# Altium integrated library CbyP.IntLib: 1144 symbols (part 2 of 6) (continued)
## FRC0603F2203TS (continued)
RES 220kΩ ±1% 100mW 0603; Manufacturer: FOJAN; Mfr.Part #: FRC0603F2203TS; Package: 0402; LCSC Part #: C2907013
footprint RES-0402
pins: 1, 2

## FRC0603F3602TS
designator R?, comment 36K
RES 36kΩ ±1% 100mW 0603; Manufacturer: FOJAN; Mfr.Part #: FRC0603F3602TS; Package: 0603; LCSC Part #: C2930097
footprint RES-0603
pins: 1, 2

## FRC0603F3901TS
designator R?, comment 3.9K
3.9kΩ ±1% 100mW 0603 Thick Film Resistor; Manufacturer: FOJAN; Mfr.Part #: FRC0603F3901TS; Package: 0603; LCSC Part #: C2907024; DigiKey Part Number: NO; ComponentLink1Description: Link; ComponentLink1URL: https://www.lcsc.com/product-detail/C2907024.html?s_z=n_3.9K; ComponentLink2Description: Link 1
footprint RES-0603
pins: 1, 2

## FRC0603F4992TS
designator R?, comment 49.9K
49.9kΩ ±1% 100mW 0603 Thick Film Resistor; Manufacturer: FOJAN; Mfr.Part #: FRC0603F4992TS; Package: 0603; LCSC Part #: C2930109; DigiKey Part Number: NO; ComponentLink1Description: Link; ComponentLink1URL: https://www.lcsc.com/product-detail/C2930109.html?s_z=n_49.9K; ComponentLink2Description: Link 1
footprint RES-0603
pins: 1, 2

## FRC0603F5231TS
designator R?, comment 5.23K
RES 5.23kΩ ±1% 100mW 0603; Manufacturer: FOJAN; Mfr.Part #: FRC0603F5231TS; Package: 0603; LCSC Part #: C2930111
footprint RES-0603
pins: 1, 2

## FRC0603F5600TS
designator R?, comment 560R
560Ω ±1% 100mW 0603 Thick Film Resistor; Manufacturer: FOJAN; Mfr.Part #: FRC0603F6492TS; Package: 0603; LCSC Part #: C2907052; DigiKey Part Number: NO; ComponentLink1Description: Link; ComponentLink1URL: https://www.lcsc.com/product-detail/C2907052.html?s_z=n_560r; ComponentLink2Description: Link 1
footprint RES-0603
footprint RES-0603-2
pins: 1, 2

## FRC0603F6201TS
designator R?, comment 6.2K
6.2kΩ ±1% 100mW 0603 Thick Film Resistor; Manufacturer: FOJAN; Mfr.Part #: FRC0603F6201TS; Package: 0603; LCSC Part #: C2907054; DigiKey Part Number: NO; ComponentLink1Description: Link; ComponentLink1URL: https://www.lcsc.com/product-detail/C2907054.html?s_z=n_6.2K; ComponentLink2Description: Link 1
footprint RES-0603
pins: 1, 2

## FRC0603F6492TS
designator R?, comment 64.9K
64.9kΩ ±1% 100mW 0603 Thick Film Resistor; Manufacturer: FOJAN; Mfr.Part #: FRC0603F6492TS; Package: 0603; LCSC Part #: C2960807; DigiKey Part Number: NO; ComponentLink1Description: Link; ComponentLink1URL: https://www.lcsc.com/product-detail/C2960807.html; ComponentLink2Description: Link 1
footprint RES-0603
pins: 1, 2

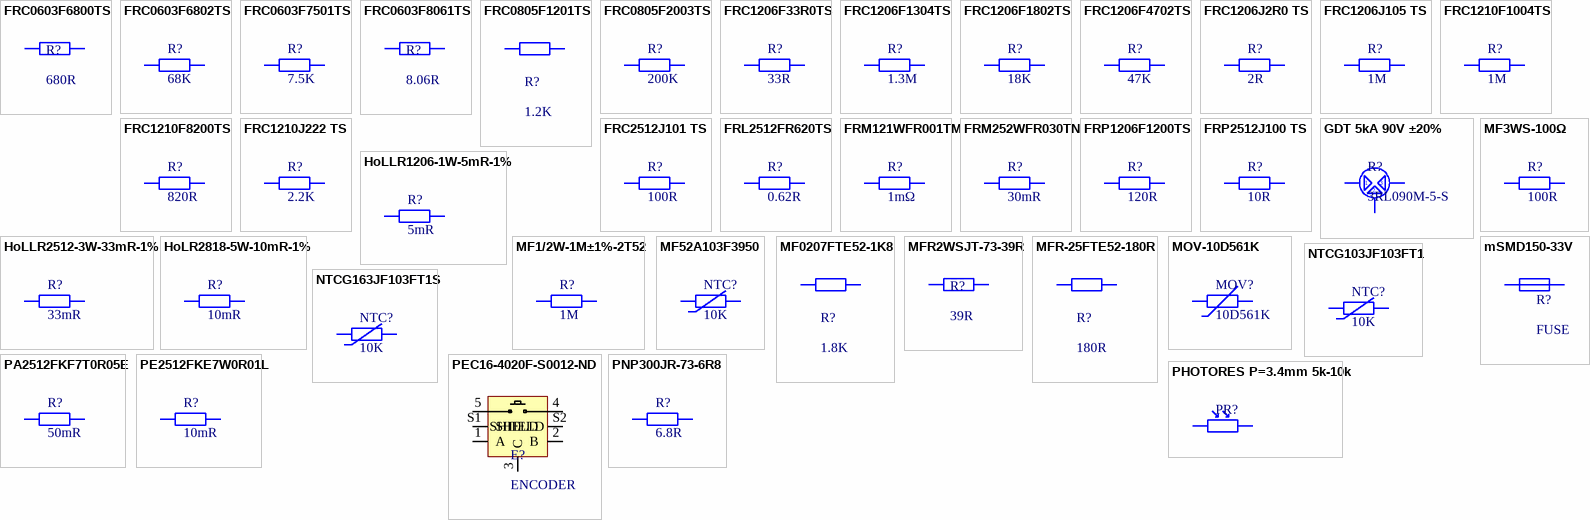
[diagram p9: symbols FRC0603F6800TS to PNP300JR-73-6R8]

## FRC0603F6800TS
designator R?, comment 680R
680Ω ±1% 100mW 0603 Thick Film Resistor; Manufacturer: FOJAN; Mfr.Part #: FRC0603F6800TS; Package: 0603; LCSC Part #: C2907062; DigiKey Part Number: NO; ComponentLink1Description: Link; ComponentLink1URL: https://www.lcsc.com/product-detail/C2907062.html?s_z=n_680r; ComponentLink2Description: Link 1
footprint RES-0603
pins: 1, 2

## FRC0603F6802TS
designator R?, comment 68K
68kΩ ±1% 100mW 0603 Thick Film Resistor; Manufacturer: FOJAN; Mfr.Part #: FRC0603F6802TS; Package: 0603; LCSC Part #: C2907063; DigiKey Part Number: NO; ComponentLink1Description: Link; ComponentLink1URL: https://www.lcsc.com/product-detail/C2907063.html?s_z=n_68K; ComponentLink2Description: Link 1
footprint RES-0603
pins: 1, 2

## FRC0603F7501TS
designator R?, comment 7.5K
7.5kΩ ±1% 100mW 0603 Thick Film Resistor; Manufacturer: FOJAN; Mfr.Part #: FOJAN; Package: 0603; LCSC Part #: C2930127; DigiKey Part Number: NO; ComponentLink1Description: Link; ComponentLink1URL: https://www.lcsc.com/product-detail/C2930127.html?s_z=n_7.5K&spm=wm.ssy.bg.0.xh&lcsc_vid=QVhYA1deElkMBVEAQVVWVAECEVVXUAcCTgNYUQVSEVAxVlNRQ1JdUlBST1daVzsOAxUeFF5JWBYZEEoKFBINSQcJGk4eFQsCAgIaSgADAwAHC0slRVVbVV1fT08GEwkK; ComponentLink2Description: Link 1
footprint RES-0603
pins: 1, 2

## FRC0603F8061TS
designator R?, comment 8.06R
8.06kΩ ±1% 100mW 0603 Thick Film Resistor; Manufacturer: FOJAN; Mfr.Part #: FRC0603F8061TS; Package: 0603; LCSC Part #: C2960681; DigiKey Part Number: NO; ComponentLink1Description: Link; ComponentLink1URL: https://www.lcsc.com/product-detail/C2960681.html?s_z=n_8.06; ComponentLink2Description: Link 1
footprint RES-0603
pins: 1, 2

## FRC0805F1201TS
designator R?, comment 1.2K
1.2kΩ ±1% 125mW 0805 Thick Film Resistor; Manufacturer: FOJAN; Mfr.Part #: FRC0805F1201TS; Package: 0805; LCSC Part #: C2933293; DigiKey Part Number: NO; ComponentLink1Description: Link; ComponentLink1URL: https://www.lcsc.com/product-detail/C2933293.html?s_z=n_1.2K; ComponentLink2Description: Link 1
footprint RES-0805-1
footprint RES-0805
pins: 1, 2

## FRC0805F2003TS
designator R?, comment 200K
RES 200kΩ ±1% 125mW 0805; Manufacturer: FOJAN; Mfr.Part #: FRC0805F2003TS; Package: 0805; LCSC Part #: C2907238; ComponentLink2Description: Link 1
footprint RES-0805-1
pins: 1, 2

## FRC1206F33R0TS
designator R?, comment 33R
RES 33Ω ±1% 250mW 1206; Manufacturer: FOJAN; Mfr.Part #: FRC1206F33R0TS; Package: 1206; LCSC Part #: C2907384
footprint RES-1206
pins: 1, 2

## FRC1206F1304TS
designator R?, comment 1.3M
RES 1.3MΩ ±1% 250mW 1206; Manufacturer: FOJAN; Mfr.Part #: FRC1206F1304TS; LCSC Part #: C2933594; Package: 1206
footprint RES-1206
pins: 1, 2

## FRC1206F1802TS
designator R?, comment 18K
RES 18kΩ ±1% 250mW 1206; Manufacturer: FOJAN; Mfr.Part #: FRC1206F1802TS; LCSC Part #: C2933614; Package: 1206
footprint RES-1206
pins: 1, 2

## FRC1206F4702TS
designator R?, comment 47K
RES 47kΩ ±1% 250mW 1206; Manufacturer: FOJAN; Mfr.Part #: FRC1206F4702TS; Package: 1206; LCSC Part #: C2933708
footprint RES-1206
pins: 1, 2

## FRC1206J2R0 TS
designator R?, comment 2R
RES 2Ω ±5% 250mW 1206; Manufacturer: FOJAN; Mfr.Part #: FRC1206J2R0 TS; LCSC Part #: C2907468; Package: 1206
footprint RES-1206
pins: 1, 2

## FRC1206J105 TS
designator R?, comment 1M
RES 1MΩ ±5% 250mW 1206; Manufacturer: FOJAN; Mfr.Part #: FRC1206J105 TS; LCSC Part #: C2907441; Package: 1206
footprint RES-1206
pins: 1, 2

## FRC1210F1004TS
designator R?, comment 1M
RES 1MΩ ±1% 500mW 1210; Manufacturer: FOJAN; Mfr.Part #: FRC1210F1004TS; Package: 1210; LCSC Part #: C2933801
footprint RES-1210
pins: 1, 2

## FRC1210F8200TS
designator R?, comment 820R
RES 820Ω ±1% 500mW 1210; Manufacturer: FOJAN; Mfr.Part #: FRC1210F8200TS; Package: 1210; LCSC Part #: C3013285
footprint RES-1210
pins: 1, 2

## FRC1210J222 TS
designator R?, comment 2.2K
500mW Thick Film Resistors 200V ±100ppm/℃ ±5% 2.2kΩ 1210 Chip Resistor - Surface Mount ROHS; Manufacturer: FOJAN; Mfr.Part #: FRC1210J222 TS; Package: 1210; LCSC Part #: C2960928
footprint RES-1210
pins: 1, 2

## FRC2512J101 TS
designator R?, comment 100R
RES 100Ω ±5% 1W 2512; Manufacturer: FOJAN; Mfr.Part #: FRC2512J101 TS; Package: 2512; LCSC Part #: C2907569
footprint RES-2512
pins: 1, 2

## FRL2512FR620TS
designator R?, comment 0.62R
RES 620mΩ ±1% 1W 2512; Manufacturer: FOJAN; Mfr.Part #: FRL2512FR620TS; LCSC Part #: C5126252; Package: 2512
footprint RES-2512-1
footprint RES-2512
pins: 1, 2

## FRM121WFR001TM
designator R?, comment 1mΩ
RES 1mΩ ±1% 1W 1206; Manufacturer: FOJAN; Mfr.Part #: FRM121WFR001TM; LCSC Part #: C7467246; Package: 1206
footprint RES-1206
pins: 1, 2

## FRM252WFR030TN
designator R?, comment 30mR
RES 30mΩ ±1% 2W 2512; Manufacturer: FOJAN; Mfr.Part #: FRM252WFR030TN; LCSC Part #: C7420006; Package: 2512
footprint RES-2512-1
footprint RES-2512
pins: 1, 2

## FRP1206F1200TS
designator R?, comment 120R
RES 120Ω ±1% 500mW 1206; Manufacturer: FOJAN; Mfr.Part #: FRP1206F1200TS; LCSC Part #: C5713417; Package: 1206
footprint RES-1206
pins: 1, 2

## FRP2512J100 TS
designator R?, comment 10R
RES 10Ω ±5% 2W 2512; Manufacturer: FOJAN; Mfr.Part #: FRP2512J100 TS; LCSC Part #: C3013385; Package: 2512
footprint RES-2512-1
footprint RES-2512
pins: 1, 2

## GDT 5kA 90V ±20%
designator R?, comment 3RL090M-5-S
±20% 5kA 90V 3 SMD,5x6.6mm Gas Discharge Tube Arresters (GDT) ROHS; Manufacturer: Brightking; Name: GDT 5kA 90V ±20%; So_Chan_Dan: 3; So_Chan_Cam: 0; Mfr.Part #: 3RL090M-5-S; Package: SMD,5x6.6mm
footprint SMD,5x6.6mm
pins: 1, 2, 3

## HoLLR1206-1W-5mR-1%
designator R?, comment 5mR
1W 5mΩ Current Sense Resistor ±1% ±50ppm/℃ 1206 Chip Resistor - Surface Mount RoHS; Manufacturer: Milliohm; Mfr.Part #: HoLLR1206-1W-5mR-1%; Package: 1206; LCSC Part #: C2988648; DigiKey Part Number: NO; ComponentLink1Description: Link; ComponentLink1URL: https://www.lcsc.com/product-detail/C2988648.html?spm=wm.fly.bg.4.xh&lcsc_vid=FAdbA1BQFQNeV1UEFlgLA1FWRVFXUVBeEwJXVAFQRVUxVlNRQ1NbVFVRQFdeVzsOAxUeFF5JWBYZEEoKFBINSQcJGk4dAgUUFAk%3D; ComponentLink2Description: Link 1
footprint RES-1206
pins: 1, 2

## HoLLR2512-3W-33mR-1%
designator R?, comment 33mR
33mΩ 3W Current Sense Resistor ±1% ±50ppm/℃ 2512 Chip Resistor - Surface Mount RoHS; Manufacturer: Milliohm; Mfr.Part #: HoLLR2512-3W-33mR-1%; Package: 2512; LCSC Part #: C2985721; DigiKey Part Number: NO; ComponentLink1Description: Link; ComponentLink1URL: https://www.lcsc.com/product-detail/C2985721.html?spm=wm.fly.bg.0.xh&lcsc_vid=EQVeAlBQE1lfUQdeRVANVgZXElUKUAUCRwdWVVRWQVUxVlNRQ1hbUlRURFJdVDtW; ComponentLink2Description: Link 1
footprint RES-2512
pins: 1, 2

## HoLR2818-5W-10mR-1%
designator R?, comment 10mR
5W 10mΩ Patch Current Sensing Resistors ±1% 2818 Current Sense Resistors / Shunt Resistors ROHS; Manufacturer: Milliohm; Mfr.Part #: HoLR2818-5W-10mR-1%; Package: 2818
footprint RES-0603
pins: 1, 2

## MF1/2W-1M±1%-2T52
designator R?, comment 1M
Metal Film Resistors 1MΩ 500mW ±100ppm/℃ ±1% Plugin,D3.5xL9mm Through Hole Resistors ROHS; Manufacturer: VO; Mfr.Part #: MF1/2W-1M±1%-2T52; So_Chan_Dan: 2; So_Chan_Cam: 0; Package: Plugin,D3.5xL9mm; Name: MF1/2W-1M±1%-2T52
footprint Plugin,D3.5xL9mm
pins: 1, 2

## MF3WS-100Ω
designator R?, comment 100R
RES 100Ω ±1% 3W Through Hole,D5xL15.5mm; Manufacturer: CCO(Chian Chia Elec); Mfr.Part #: MF3WS-100Ω±1% T; Package: Through Hole,D5xL15.5mm; LCSC Part #: C119698
footprint Through Hole,P=5mm,15.5x5mm
pins: 1, 2

## MF52A103F3950
designator NTC?, comment 10K
THERMISTOR NTC 10kΩ 3950K TH; Mfr.Part #: MF52A103F3950; Manufacturer: SURGING; Package: 0402; DigiKey Part Number: Through Hole,P=2mm; LCSC Part #: C5439706
footprint CAP-0402
pins: 1, 2

## MF0207FTE52-1K8
designator R?, comment 1.8K
RES 1.8kΩ ±1% 600mW Through Hole,D2.4xL6.3mm; Manufacturer: YAGEO; Mfr.Part #: MF0207FTE52-1K8; Package: Through Hole,D2.4xL6.3mm; LCSC Part #: C1373822
footprint Through Hole,D2.4xL6.3mm
pins: 1, 2

## MFR2WSJT-73-39R
designator R?, comment 39R
39Ω 2W Metal Film Resistor ±5% Through Hole,D4.5xL11.5mm Through Hole Resistors RoHS; Manufacturer: YAGEO; Mfr.Part #: MFR2WSJT-73-39R; Package: Through Hole,D4.5xL11.5mm; LCSC Part #: C176578; DigiKey Part Number: NO; ComponentLink1Description: Link; ComponentLink1URL: https://www.lcsc.com/product-detail/C176578.html?s_z=n_C176578; ComponentLink2Description: Link 1
footprint Plugin,D4.5xL11.5mm
pins: 1, 2

## MFR-25FTE52-180R
designator R?, comment 180R
RES 180Ω ±1% 250mW Through Hole,D2.4xL6.3mm; Manufacturer: YAGEO; Mfr.Part #: MFR-25FTE52-180R; Package: Through Hole,D2.4xL6.3mm; LCSC Part #: C172976
footprint Through Hole,D2.4xL6.3mm
pins: 1, 2

## MOV-10D561K
designator MOV?, comment 10D561K
925V 460V 350V 560V Through Hole,P=7.5mm Varistors, MOVs ROHS; Manufacturer: Bourns Inc.; Mfr.Part #: MOV-10D561K; Package: Through Hole,P=7.5mm; LCSC Part #: C3263770; DigiKey Part Number: 118-MOV-10D561K-ND
footprint Through Hole,P=7.5mm - 1
pins: 1, 2

## mSMD150-33V
designator R?, comment FUSE
33V 1.5A 100A 3A 1812 Resettable Fuses ROHS; Manufacturer: TECHFUSE; Mfr.Part #: mSMD150-33V; Package: 1812; LCSC Part #: C2937110
footprint CAP-0402
pins: 1, 2

## NTCG103JF103FT1
designator NTC?, comment 10K
10kΩ ±1% 310uA 3380K 100mW ±1% 0402 NTC Thermistors RoHS; Mfr.Part #: NTCG103JF103FT1; Manufacturer: TDK; Package: 0402; DigiKey Part Number: 445-2550-2-ND; LCSC Part #: C209959
footprint CAP-0402
pins: 1, 2

## NTCG163JF103FT1S
designator NTC?, comment 10K
THERMISTOR NTC 10kΩ 3380K 0603; Mfr.Part #: NTCG163JF103FT1S; Manufacturer: TDK; Package: 0603; LCSC Part #: C406719
footprint NTC-0603
pins: 1, 2

## PA2512FKF7T0R05E
designator R?, comment 50mR
3W ±100ppm/℃ ±1% 50mΩ 2512 Chip Resistor - Surface Mount ROHS; Manufacturer: YAGEO; Mfr.Part #: PA2512FKF7T0R05E; Package: 2512
footprint RES-2512
pins: 1, 2

## PE2512FKE7W0R01L
designator R?, comment 10mR
RES 10mΩ ±1% 2W 2512; Manufacturer: YAGEO; Mfr.Part #: PE2512FKE7W0R01L; Package: 2512; LCSC Part #: C875720; DigiKey Part Number: YAG2167TR-ND
footprint RES-2512
pins: 1, 2

## PEC16-4020F-S0012-ND
designator E?, comment ENCODER
Rotary Encoder Mechanical 12 Quadrature (Incremental) Vertical; Manufacturer: Bourns Inc.; Mfr.Part #: PEC16-4020F-S0012; Package: Through Hole; LCSC Part #: NO; DigiKey Part Number: PEC16-4020F-S0012-ND
footprint EC16
pins: 1 A, 2 B, 3 C, 4 BT2, 5 BT1, S1 SHIELD, S2 SHIELD

## PHOTORES P=3.4mm 5k-10k
designator PR?, comment Photoresistors  (value not drawn)
5kΩ~10kΩ 540nm 200kΩ Plugin,P=3.4mm Photoresistors ROHS; Mfr.Part #: GL5516(5-10); Manufacturer: JCHL(Shenzhen Jing Chuang He Li Tech); So_Chan_Dan: 0; Name: PHOTORES  5kΩ~10kΩ 540nm Plugin,P=3.4mm; So_Chan_Cam: 2; Package: Plugin,P=3.4mm
footprint Plugin,P=3.4mm
pins: 1, 2

## PNP300JR-73-6R8
designator R?, comment 6.8R
RES 6.8Ω ±5% 3W Through Hole,D4.6xL11.5mm; Manufacturer: YAGEO; Mfr.Part #: PNP300JR-73-6R8; Package: Through Hole,D4.6xL11.5mm; LCSC Part #: C1763209
footprint Through Hole,P=5mm,11.5x4.6mm
pins: 1, 2

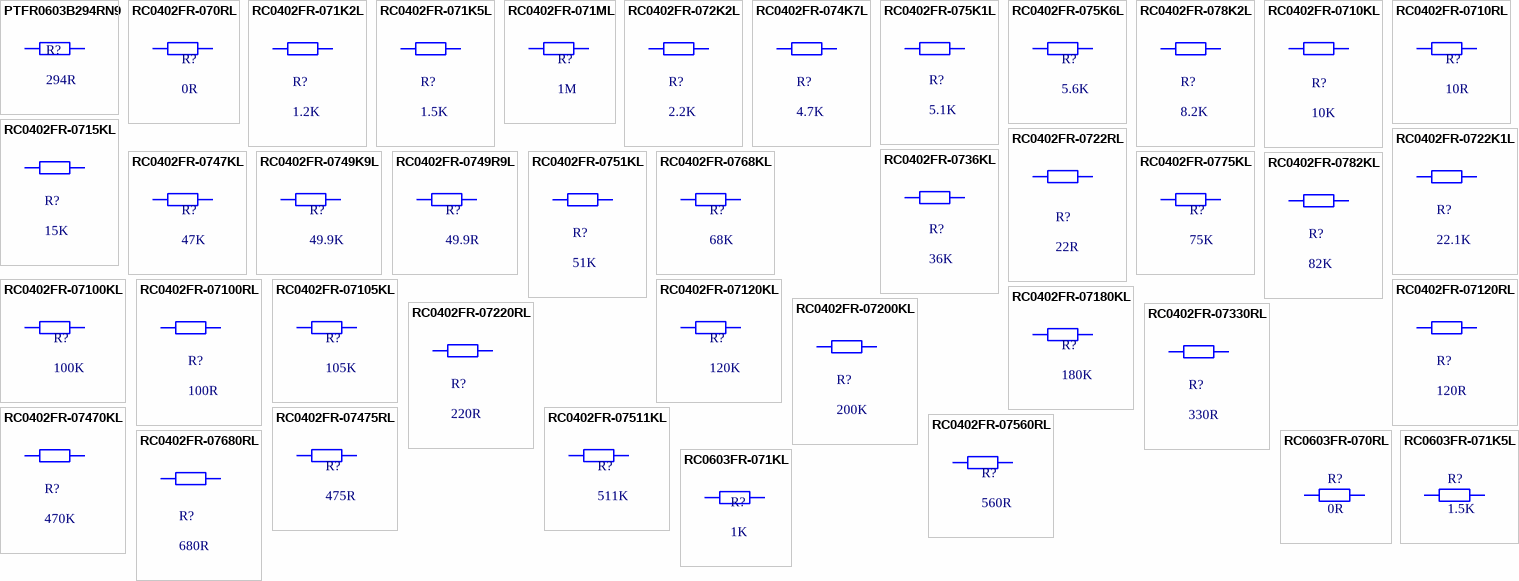
[diagram p10: symbols PTFR0603B294RN9 to RC0603FR-071KL]

## PTFR0603B294RN9
designator R?, comment 294R
100mW 294Ω 100V Thin Film Resistor ±0.1% ±10ppm/℃ 0603 Chip Resistor - Surface Mount RoHS; Manufacturer: RESI; Mfr.Part #: PTFR0603B294RN9; Package: 0603; LCSC Part #: C47115923; DigiKey Part Number: NO; ComponentLink1Description: Link; ComponentLink1URL: https://www.lcsc.com/product-detail/C47115923.html; ComponentLink2Description: Link 1
footprint CAP-0603
pins: 1, 2

## RC0402FR-070RL
designator R?, comment 0R
62.5mW Thick Film Resistor 50V ±1% 0Ω 0402 Chip Resistor - Surface Mount ROHS; Manufacturer: YAGEO; Mfr.Part #: RC0402FR-070RL; Package: 0402; LCSC Part #: C106231; DigiKey Part Number: 311-0.0LRTR-ND
footprint RES-0402
pins: 1, 2

## RC0402FR-071K2L
designator R?, comment 1.2K
62.5mW 1.2kΩ 50V ±100ppm/℃ Thick Film Resistor ±1% 0402 Chip Resistor - Surface Mount RoHS; Manufacturer: YAGEO; Mfr.Part #: RC0402FR-071K2L; Package: 0402; LCSC Part #: C138040; DigiKey Part Number: 311-1.20KLRTR-ND
footprint RES-0402
pins: 1, 2

## RC0402FR-071K5L
designator R?, comment 1.5K
62.5mW 1.5kΩ 50V ±100ppm/℃ Thick Film Resistor ±1% 0402 Chip Resistor - Surface Mount RoHS; Manufacturer: YAGEO; Mfr.Part #: RC0402FR-071K5L; Package: 0402; LCSC Part #: C114759; DigiKey Part Number: 311-1.50KLRTR-ND
footprint RES-0402
pins: 1, 2

## RC0402FR-071ML
designator R?, comment 1M
62.5mW Thick Film Resistor 50V ±100ppm/℃ ±1% 1MΩ 0402 Chip Resistor - Surface Mount ROHS; Manufacturer: YAGEO; Mfr.Part #: RC0402FR-071ML; Package: 0402; LCSC Part #: C138033
footprint RES-0402
pins: 1, 2

## RC0402FR-072K2L
designator R?, comment 2.2K
62.5mW 2.2kΩ 50V ±100ppm/℃ Thick Film Resistor ±1% 0402 Chip Resistor - Surface Mount RoHS; Manufacturer: YAGEO; Mfr.Part #: RC0402FR-072K2L; Package: 0402; LCSC Part #: C114762; DigiKey Part Number: 311-2.20KLRTR-ND
footprint RES-0402
pins: 1, 2

## RC0402FR-074K7L
designator R?, comment 4.7K
62.5mW Thick Film Resistor 50V ±100ppm/℃ ±1% 4.7kΩ 0402 Chip Resistor - Surface Mount ROHS; Manufacturer: YAGEO; Mfr.Part #: RC0402FR-074K7L; Package: 0402; LCSC Part #: C105871; DigiKey Part Number: 311-4.7KLRTR-ND
footprint RES-0402
pins: 1, 2

## RC0402FR-075K1L
designator R?, comment 5.1K
5.1kΩ 62.5mW 50V ±100ppm/℃ Thick Film Resistor ±1% 0402 Chip Resistor - Surface Mount RoHS; Manufacturer: YAGEO; Mfr.Part #: RC0402FR-075K1L; Package: 0402; LCSC Part #: C105872; DigiKey Part Number: 311-5.10KLRTR-ND
footprint RES-0402
pins: 1, 2

## RC0402FR-075K6L
designator R?, comment 5.6K
5.6kΩ 62.5mW 50V ±100ppm/℃ Thick Film Resistor ±1% 0402 Chip Resistor - Surface Mount ROHS; Manufacturer: YAGEO; Mfr.Part #: RC0402FR-075K6L; Package: 0402; LCSC Part #: C163457
footprint RES-0402
pins: 1, 2

## RC0402FR-078K2L
designator R?, comment 8.2K
8.2kΩ 62.5mW 50V ±100ppm/℃ Thick Film Resistor ±1% 0402 Chip Resistor - Surface Mount RoHS; Manufacturer: YAGEO; Mfr.Part #: RC0402FR-078K2L; Package: 0402; LCSC Part #: C137929; DigiKey Part Number: 311-8.20KLRTR-ND
footprint RES-0402
pins: 1, 2

## RC0402FR-0710KL
designator R?, comment 10K
62.5mW Thick Film Resistors 50V ±100ppm/℃ ±1% 10kΩ 0402 Chip Resistor - Surface Mount ROHS; Manufacturer: YAGEO; Mfr.Part #: RC0402FR-0710KL; Package: 0402; LCSC Part #: C60490; DigiKey Part Number: 311-10.0KLRTR-ND
footprint RES-0402
pins: 1, 2

## RC0402FR-0710RL
designator R?, comment 10R
10Ω 62.5mW 50V Thick Film Resistor ±1% ±200ppm/℃ 0402 Chip Resistor - Surface Mount RoHS; Manufacturer: YAGEO; Mfr.Part #: RC0402FR-0710RL; Package: 0402; LCSC Part #: C138066; DigiKey Part Number: 311-10.0LRTR-ND
footprint RES-0402
pins: 1, 2

## RC0402FR-0715KL
designator R?, comment 15K
15kΩ 62.5mW 50V Thick Film Resistor ±100ppm/℃ ±1% 0402 Chip Resistor - Surface Mount RoHS; Manufacturer: YAGEO; Mfr.Part #: RC0402FR-0715KL; Package: 0402; LCSC Part #: C114761; DigiKey Part Number: 311-4.7KLRTR-ND; ComponentLink1Description: Link; ComponentLink1URL: https://www.lcsc.com/product-detail/C114761.html?s_z=n_15K; ComponentLink2Description: Link 1; ComponentLink2URL: https://www.digikey.com/en/products/detail/yageo/RC0402FR-0715KL/726541?s=N4IgTCBcDaIEoGEAMAWJYBicC0SDsAjAKwDSAMiALoC%2BQA
footprint RES-0402
pins: 1, 2

## RC0402FR-0722K1L
designator R?, comment 22.1K
22.1kΩ 62.5mW 50V ±100ppm/℃ Thick Film Resistor ±1% 0402 Chip Resistor - Surface Mount RoHS; Manufacturer: YAGEO; Mfr.Part #: RC0402FR-0722K1L; Package: 0402; LCSC Part #: C163478; DigiKey Part Number: 311-22.1KLRTR-ND
footprint RES-0402
pins: 1, 2

## RC0402FR-0722RL
designator R?, comment 22R
62.5mW Thick Film Resistor 50V ±100ppm/℃ ±1% 22Ω 0402 Chip Resistor - Surface Mount ROHS; Manufacturer: YAGEO; Mfr.Part #: RC0402FR-0722RL; Package: 0402; LCSC Part #: C114765; DigiKey Part Number: 311-22.0LRTR-ND
footprint RES-0402
pins: 1, 2

## RC0402FR-0736KL
designator R?, comment 36K
62.5mW Thick Film Resistor 50V ±100ppm/℃ ±1% 36kΩ 0402 Chip Resistor - Surface Mount ROHS; Manufacturer: YAGEO; Mfr.Part #: RC0402FR-0736KL; Package: 0402; LCSC Part #: C137999; DigiKey Part Number: 311-36.0KLRTR-ND
footprint RES-0402
pins: 1, 2

## RC0402FR-0747KL
designator R?, comment 47K
62.5mW Thick Film Resistor 50V ±1% 0Ω 0402 Chip Resistor - Surface Mount ROHS; Manufacturer: YAGEO; Mfr.Part #: RC0402FR-0747KL; Package: 0402; LCSC Part #: C93943; DigiKey Part Number: 311-47.0KLRTR-ND
footprint RES-0402
pins: 1, 2

## RC0402FR-0749K9L
designator R?, comment 49.9K
62.5mW 49.9kΩ 50V ±100ppm/℃ Thick Film Resistor ±1% 0402 Chip Resistor - Surface Mount ROHS; Manufacturer: YAGEO; Mfr.Part #: RC0402FR-0749K9L; Package: 0402; LCSC Part #: C137969
footprint RES-0402
pins: 1, 2

## RC0402FR-0749R9L
designator R?, comment 49.9R
49.9Ω 62.5mW 50V ±100ppm/℃ Thick Film Resistor ±1% 0402 Chip Resistor - Surface Mount ROHS; Manufacturer: YAGEO; Mfr.Part #: RC0402FR-0749R9L; Package: 0402; LCSC Part #: C87044; DigiKey Part Number: 311-49.9LRTR-ND
footprint RES-0402
pins: 1, 2

## RC0402FR-0751KL
designator R?, comment 51K
62.5mW 51kΩ 50V ±100ppm/℃ Thick Film Resistor ±1% 0402 Chip Resistor - Surface Mount RoHS; Manufacturer: YAGEO; Mfr.Part #: RC0402FR-0751KL; Package: 0402; LCSC Part #: C107229; DigiKey Part Number: 311-51.0KLRTR-ND
footprint RES-0402
pins: 1, 2

## RC0402FR-0768KL
designator R?, comment 68K
68kΩ 62.5mW 50V ±100ppm/℃ Thick Film Resistor ±1% 0402 Chip Resistor - Surface Mount RoHS; Manufacturer: YAGEO; Mfr.Part #: RC0402FR-0768KL; Package: 0402; LCSC Part #: C137947; DigiKey Part Number: 311-68.0KLRTR-ND
footprint RES-0402
pins: 1, 2

## RC0402FR-0775KL
designator R?, comment 75K
62.5mW Thick Film Resistor 50V ±1% 0Ω 0402 Chip Resistor - Surface Mount ROHS; Manufacturer: YAGEO; Mfr.Part #: RC0402FR-0775KL; Package: 0402; LCSC Part #: C137935
footprint RES-0402
pins: 1, 2

## RC0402FR-0782KL
designator R?, comment 82K
62.5mW 82kΩ 50V ±100ppm/℃ Thick Film Resistor ±1% 0402 Chip Resistor - Surface Mount RoHS; Manufacturer: YAGEO; Mfr.Part #: RC0402FR-0782KL; Package: 0402; LCSC Part #: C137932; DigiKey Part Number: 311-82.0KLRTR-ND
footprint RES-0402
pins: 1, 2

## RC0402FR-07100KL
designator R?, comment 100K
62.5mW Thick Film Resistors 50V ±100ppm/℃ ±1% 100kΩ 0402 Chip Resistor - Surface Mount ROHS; Manufacturer: YAGEO; Mfr.Part #: RC0402FR-07100KL; Package: 0402; LCSC Part #: C60491; DigiKey Part Number: 311-100KLRTR-ND
footprint RES-0402
pins: 1, 2

## RC0402FR-07100RL
designator R?, comment 100R
62.5mW Thick Film Resistors 50V ±100ppm/℃ ±1% 100Ω 0402 Chip Resistor - Surface Mount ROHS; Manufacturer: YAGEO; Mfr.Part #: RC0402FR-07100RL; Package: 0402; LCSC Part #: C106232; DigiKey Part Number: 311-100LRTR-ND
footprint RES-0402
pins: 1, 2

## RC0402FR-07105KL
designator R?, comment 105K
62.5mW 105kΩ 50V ±100ppm/℃ Thick Film Resistor ±1% 0402 Chip Resistor - Surface Mount ROHS; Manufacturer: YAGEO; Mfr.Part #: RC0402FR-07105KL; Package: 0402; LCSC Part #: C171671; DigiKey Part Number: YAG2946TR-ND
footprint RES-0402
pins: 1, 2

## RC0402FR-07120KL
designator R?, comment 120K
62.5mW 120kΩ 50V ±100ppm/℃ Thick Film Resistor ±1% 0402 Chip Resistor - Surface Mount RoHS; Manufacturer: YAGEO; Mfr.Part #: RC0402FR-07120KL; Package: 0402; LCSC Part #: C93945; DigiKey Part Number: 311-120KLRTR-ND
footprint RES-0402
pins: 1, 2

## RC0402FR-07120RL
designator R?, comment 120R
120Ω 62.5mW 50V ±100ppm/℃ Thick Film Resistor ±1% 0402 Chip Resistor - Surface Mount RoHS; Manufacturer: YAGEO; Mfr.Part #: RC0402FR-07120RL; Package: 0402; LCSC Part #: C114758; DigiKey Part Number: 311-120LRTR-ND
footprint RES-0402
pins: 1, 2

## RC0402FR-07180KL
designator R?, comment 180K
62.5mW 180kΩ 50V ±100ppm/℃ Thick Film Resistor ±1% 0402 Chip Resistor - Surface Mount RoHS; Manufacturer: YAGEO; Mfr.Part #: RC0402FR-07180KL; Package: 0402; LCSC Part #: C138046; DigiKey Part Number: 311-180KLRTR-ND
footprint RES-0402
pins: 1, 2

## RC0402FR-07200KL
designator R?, comment 200K
200kΩ 62.5mW 50V Thick Film Resistor ±100ppm/℃ ±1% 0402 Chip Resistor - Surface Mount RoHS; Manufacturer: YAGEO; Mfr.Part #: RC0402FR-07200KL; Package: 0402; LCSC Part #: C114763; DigiKey Part Number: 311-200KLRTR-ND; ComponentLink1Description: Link; ComponentLink1URL: https://www.lcsc.com/product-detail/C114763.html?s_z=n_200K; ComponentLink2Description: Link 1; ComponentLink2URL: https://www.digikey.com/en/products/detail/yageo/RC0402FR-07200KL/726558?s=N4IgTCBcDaIEoGEAMAWJYBicC0SDsYSSA0gDIgC6AvkA
footprint RES-0402
pins: 1, 2

## RC0402FR-07220RL
designator R?, comment 220R
62.5mW Thick Film Resistors 50V ±100ppm/℃ ±1% 220Ω 0402 Chip Resistor - Surface Mount ROHS; Manufacturer: YAGEO; Mfr.Part #: RC0402FR-07220RL; Package: 0402; LCSC Part #: C112291; DigiKey Part Number: 311-220LRTR-ND
footprint RES-0402
pins: 1, 2

## RC0402FR-07330RL
designator R?, comment 330R
330Ω 62.5mW 50V ±100ppm/℃ Thick Film Resistor ±1% 0402 Chip Resistor - Surface Mount RoHS; Manufacturer: YAGEO; Mfr.Part #: RC0402FR-07330RL; Package: 0402; LCSC Part #: C105875; DigiKey Part Number: 311-330LRTR-ND
footprint RES-0402
pins: 1, 2
